# Altium footprint library PrintNC_GRBLHAL_Breakout.PcbLib: 51 footprints (part 4 of 5)
Each footprint in its own frame and in the unit in brackets; x right, y up, seen from the top. Pads: shape width x height; smd on the part's side, far side on the other; paste and mask are expansions set on the pad; w line width, h text height; cw(c..) or ccw(c..) is an arc to the next point about the centre after c.
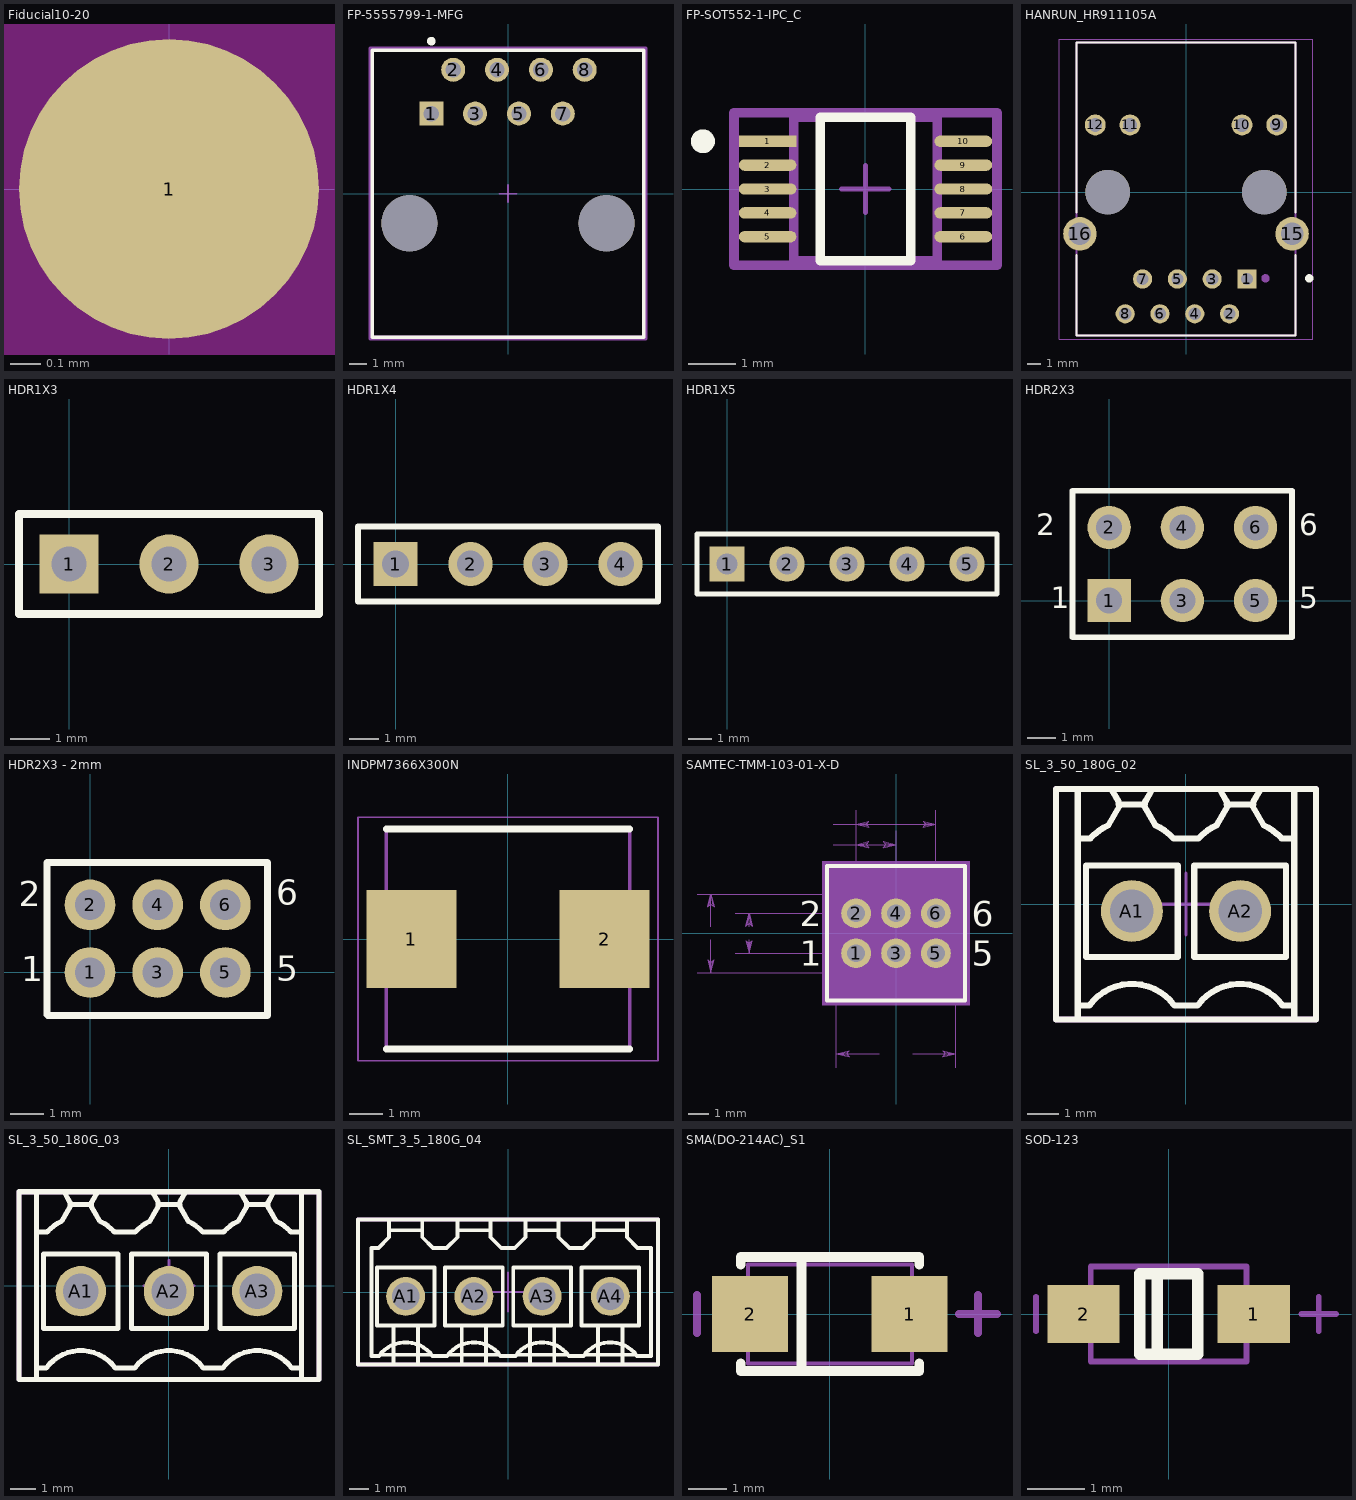
[diagram p3: the footprints below, top view; thin cyan lines are the x and y axes]

## Fiducial10-20 [mm]
height 0.6
pads (1):
  round 1 smd mask+0.5: 1(0,0)
Top Layer keep-out:
  circle w1.178: c0,0 r0.5

## FP-5555799-1-MFG [mm]
pads (10):
  rect 1.39x1.39 hole 0.89 paste-1000 mask+0: 1(-4.445,4.64)
  round 1.39 hole 0.89 paste-1000 mask+0: 2(-3.175,7.18) 3(-1.905,4.64) 4(-0.635,7.18) 5(0.635,4.64) 6(1.905,7.18) 7(3.175,4.64) 8(4.445,7.18)
  round 3.25 hole 3.25 unplated paste-1000 mask+0: ""(-5.715,-1.71) ""(5.715,-1.71)
Top Overlay:
  circle w0.25: c-4.445,8.84 r0.125
  lines w0.2: -7.875,-8.32 7.875,-8.32 7.875,8.32 -7.875,8.32 -7.875,-8.32
Top 3D Body:
  lines w0.2: -7.875,-8.32 7.875,-8.32 7.875,8.32 -7.875,8.32 -7.875,-8.32
Top Courtyard:
  lines w0.2: -7.975,-8.42 7.975,-8.42 7.975,8.42 -7.975,8.42 -7.975,-8.42
Top Assembly:
  lines w0.2: -7.975,-8.42 7.975,-8.42 7.975,8.42 -7.975,8.42 -7.975,-8.42
  text ".Designator" at 0,0.189 h1
Top Component Center:
  lines w0.1: -0.5,0 0.5,0 ; 0,-0.5 0,0.5
3D body "Conn_TE_Connectivity_5555799-1_eec.STEP": height 0.25, standoff 0, extent -7.975,-8.42 7.975,8.42

## FP-SOT552-1-IPC_C [mm]
height 0.6
pads (10):
  rect 1.209x0.236 smd paste+0 mask+0: 1(-2.052,1)
  rrect100% 1.209x0.236 smd paste+0 mask+0: 2(-2.052,0.5) 3(-2.052,0) 4(-2.052,-0.5) 5(-2.052,-1) 6(2.052,-1) 7(2.052,-0.5) 8(2.052,0) 9(2.052,0.5) 10(2.052,1)
Top Overlay:
  circle w0.25: c-3.406,1 r0.125
  lines w0.2: -0.947,-1.5 -0.947,1.5 0.947,1.5 0.947,-1.5 -0.947,-1.5
Top 3D Body:
  lines w0.2: -1.5,-1.5 -1.5,1.5 1.5,1.5 1.5,-1.5 -1.5,-1.5
Top Courtyard:
  lines w0.2: -2.756,-1.6 -2.756,1.6 2.756,1.6 2.756,-1.6 -2.756,-1.6
Top Assembly:
  lines w0.2: -2.756,-1.6 -2.756,1.6 2.756,1.6 2.756,-1.6 -2.756,-1.6
  text ".Designator" at 0,0.189 h1
Top Component Center:
  lines w0.1: -0.5,0 0.5,0 ; 0,-0.5 0,0.5
3D body "IC_NXP_PCA9615DPJ_eec.STEP": height 0.25, standoff 0, extent -2.756,-1.6 2.756,1.6

## HANRUN_HR911105A [mm]
pads (16):
  rect 1.398x1.398 hole 0.89: 1(4.45,-6.35)
  round 1.398 hole 0.89: 2(3.18,-8.89) 3(1.91,-6.35) 4(0.64,-8.89) 5(-0.63,-6.35) 6(-1.9,-8.89) 7(-3.17,-6.35) 8(-4.44,-8.89)
  round 1.53 hole 1.02: 9(6.625,4.9) 10(4.085,4.9) 11(-4.085,4.9) 12(-6.625,4.9)
  round 2.445 hole 1.63: 15(7.745,-3.05) 16(-7.745,-3.05)
  round 3.25 hole 3.25 unplated: ""(-5.715,0) ""(5.715,0)
Top Overlay:
  circle w0.3: c9,-6.3 r0.15
  lines w0.127: -8,-4.6 -8,-10.48 8,-10.48 8,-4.6 ; -8,-1.5 -8,10.92 8,10.92 8,-1.5
Mechanical 13:
  circle w0.3: c5.8,-6.3 r0.15
  lines w0.127: -8,-10.48 8,-10.48 8,10.92 -8,10.92 -8,-10.48
Mechanical 15:
  lines w0.05: -9.25,-10.73 9.25,-10.73 9.25,11.17 -9.25,11.17 -9.25,-10.73

## HDR1X3 [mm] "Connector; Header; 3 Position"
height 0.6
pads (3):
  rect 1.5x1.5 hole 0.9: 1(0,0)
  round 1.5 hole 0.9: 2(2.54,0) 3(5.08,0)
Top Overlay:
  lines w0.2: -1.27,-1.27 -1.27,1.27 6.35,1.27 6.35,-1.27 -1.27,-1.27

## HDR1X4 [mm] "Connector; Header; 4 Position"
pads (4):
  rect 1.5x1.5 hole 0.9: 1(0,0)
  round 1.5 hole 0.9: 2(2.54,0) 3(5.08,0) 4(7.62,0)
Top Overlay:
  lines w0.2: -1.27,-1.27 8.89,-1.27 8.89,1.27 -1.27,1.27 -1.27,-1.27

## HDR1X5 [mm] "Connector; Header; 5 Position"
height 0.6
pads (5):
  rect 1.5x1.5 hole 0.9: 1(0,0)
  round 1.5 hole 0.9: 2(2.54,0) 3(5.08,0) 4(7.62,0) 5(10.16,0)
Top Overlay:
  lines w0.2: -1.27,-1.27 11.43,-1.27 11.43,1.27 -1.27,1.27 -1.27,-1.27

## HDR2X3 [mm] "Connector; Header; 3x2 Position"
pads (6):
  rect 1.5x1.5 hole 0.9: 1(0,0)
  round 1.5 hole 0.9: 2(0,2.54) 3(2.54,0) 4(2.54,2.54) 5(5.08,0) 6(5.08,2.54)
Top Overlay:
  lines w0.2: 1.482,-1.27 6.35,-1.27 ; 6.35,-1.27 -1.27,-1.27 -1.27,3.81 6.35,3.81 6.35,-1.27
  text "1" at -2.032,-0.508 h1.27
  text "2" at -2.54,2.032 h1.27
  text "5" at 6.604,-0.508 h1.27
  text "6" at 6.604,2.032 h1.27

## HDR2X3 - 2mm [mm] "Connector; Header; 3x2 Position"
pads (6):
  round 1.5 hole 0.9: 1(0,0) 2(0,2) 3(2,0) 4(2,2) 5(4,0) 6(4,2)
Top Overlay:
  lines w0.2: -1.27,-1.25 -1.27,3.25 5.25,3.25 5.25,-1.27 -1.25,-1.27
  text "6" at 5.5,1.75 h1.27
  text "5" at 5.5,-0.5 h1.27
  text "2" at -2.1,1.7 h1.27
  text "1" at -2.032,-0.508 h1.27

## INDPM7366X300N [mm]
pads (2):
  rect 2.7x2.95 smd: 1(-2.9,0) 2(2.9,0)
Top Overlay:
  lines w0.2: -3.65,-3.3 3.65,-3.3 ; -3.65,3.3 3.65,3.3
Mechanical 13:
  lines w0.1: -3.65,-3.3 3.65,-3.3 3.65,3.3 -3.65,3.3 -3.65,-3.3
Mechanical 15:
  lines w0.05: -4.5,-3.65 4.5,-3.65 4.5,3.65 -4.5,3.65 -4.5,-3.65
3D body "MHCI06030-220M-R8.stp": height 3, standoff 0, extent -3.65,-3.3 3.65,3.3

## SAMTEC-TMM-103-01-X-D [mm]
pads (6):
  round 1.49 hole 0.89 mask+0: 1(-2,-1) 2(-2,1) 3(0,-1) 4(0,1) 5(2,-1) 6(2,1)
Top Overlay:
  lines w0.2: -3.45,-3.37 -3.45,3.37 3.45,3.37 3.45,-3.37 -3.45,-3.37
  text "1" at -4.82,-1.635 h1.27
  text "2" at -4.82,0.365 h1.27
  text "5" at 3.791,-1.635 h1.27
  text "6" at 3.791,0.365 h1.27
Top Paste:
  drawing of 6 lines, arcs and shapes, not listed
Top Solder:
  circle w0: c-2,-1 r0.796
  circle w0: c-2,1 r0.796
  circle w0: c0,-1 r0.796
  circle w0: c0,1 r0.796
  circle w0: c2,-1 r0.796
  circle w0: c2,1 r0.796
Bottom Solder:
  circle w0: c-2,-1 r0.796
  circle w0: c-2,1 r0.796
  circle w0: c0,-1 r0.796
  circle w0: c0,1 r0.796
  circle w0: c2,-1 r0.796
  circle w0: c2,1 r0.796
Mechanical 13:
  lines w0: -9.972,-1.968 -3.686,-1.968 ; -9.972,1.968 -3.686,1.968 ; -9.271,-0.318 -9.271,-1.968 ; -9.271,0.318 -9.271,1.968 ; -8.067,-1 -2.701,-1 ; -8.067,1 -2.701,1 ; -7.366,-0.318 -7.366,-1 ; -7.366,0.318 -7.366,1 ; -3.15,4.445 -2,4.445 ; -3.15,5.461 -2,5.461 ; -2.984,-6.734 -2.984,-2.67 ; -2,5.146 -2,1.701 -2,6.162 ; -0.851,-6.032 -2.984,-6.032 ; 0,1.701 0,5.146 ; 0.851,-6.032 2.984,-6.032 ; 2,1.701 2,6.162 ; 2.984,-6.734 2.984,-2.67 ; -9.43,-1.334 -9.271,-1.968 ; -9.43,-1.334 -9.271,-1.46 ; -9.43,-1.334 -9.35,-1.397 -9.271,-1.968 ; -9.271,-1.968 -9.112,-1.334 -9.271,-1.46 ; -9.271,-1.968 -9.192,-1.397 -9.271,-1.46 ; -9.271,-1.968 -9.271,-1.46 ; -9.271,1.46 -9.43,1.334 -9.271,1.968 ; -9.271,1.46 -9.112,1.334 ; -9.271,1.46 -9.35,1.397 -9.271,1.968 ; -9.271,1.46 -9.271,1.968 ; -9.271,1.968 -9.112,1.334 ; -9.271,1.968 -9.192,1.397 -9.112,1.334 ; -7.525,-0.365 -7.366,-1 ; -7.525,-0.365 -7.366,-0.492 ; -7.525,-0.365 -7.445,-0.428 -7.366,-1 ; -7.366,-1 -7.207,-0.365 -7.366,-0.492 ; -7.366,-1 -7.287,-0.428 -7.366,-0.492 ; -7.366,-1 -7.366,-0.492 ; -7.366,0.492 -7.525,0.365 -7.366,1 ; -7.366,0.492 -7.207,0.365 ; -7.366,0.492 -7.445,0.428 -7.366,1 ; -7.366,0.492 -7.366,1 ; -7.366,1 -7.207,0.365 ; -7.366,1 -7.287,0.428 -7.207,0.365 ; -2.984,-6.032 -2.35,-5.874 ; -2.984,-6.032 -2.35,-6.191 -2.476,-6.032 ; -2.984,-6.032 -2.413,-6.112 -2.476,-6.032 ; -2.984,-6.032 -2.476,-6.032 ; -2.984,-6.032 -2.413,-5.953 -2.35,-5.874 ; -2.476,-6.032 -2.35,-5.874 ; -2,4.445 -1.365,4.604 ; -2,4.445 -1.365,4.286 -1.492,4.445 ; -2,4.445 -1.428,4.366 -1.492,4.445 ; -2,4.445 -1.492,4.445 ; -2,4.445 -1.428,4.524 -1.365,4.604 ; -2,4.445 0,4.445 ; -2,5.461 -1.365,5.62 ; -2,5.461 -1.365,5.302 -1.492,5.461 ; -2,5.461 -1.428,5.382 -1.492,5.461 ; -2,5.461 -1.492,5.461 ; -2,5.461 -1.428,5.54 -1.365,5.62 ; -2,5.461 2,5.461 ; -1.492,4.445 -1.365,4.604 ; -1.492,5.461 -1.365,5.62 ; -0.635,4.286 0,4.445 ; -0.635,4.286 -0.508,4.445 ; -0.635,4.286 -0.572,4.366 0,4.445 ; -0.508,4.445 -0.635,4.604 0,4.445 ; -0.508,4.445 -0.572,4.524 0,4.445 ; -0.508,4.445 0,4.445 ; 1.365,5.302 2,5.461 ; 1.365,5.302 1.492,5.461 ; 1.365,5.302 1.428,5.382 2,5.461 ; 1.492,5.461 1.365,5.62 2,5.461 ; 1.492,5.461 1.428,5.54 2,5.461 ; 1.492,5.461 2,5.461 ; 2.35,-6.191 2.984,-6.032 ; 2.35,-6.191 2.476,-6.032 ; 2.35,-6.191 2.413,-6.112 2.984,-6.032 ; 2.476,-6.032 2.35,-5.874 2.984,-6.032 ; 2.476,-6.032 2.413,-5.953 2.984,-6.032 ; 2.476,-6.032 2.984,-6.032
  lines w0.1: -3.45,-3.37 -3.45,3.37 3.45,3.37 3.45,-3.37 -3.45,-3.37 ; -3,-1.968 -1,-1.968 1,-1.968 3,-1.968 3,1.968 1,1.968 -1,1.968 -3,1.968 -3,-1.968 ; -2.254,-1.254 -1.746,-1.254 -1.746,-0.746 -2.254,-0.746 -2.254,-1.254 ; -2.254,0.746 -1.746,0.746 -1.746,1.254 -2.254,1.254 -2.254,0.746 ; -0.254,-1.254 0.254,-1.254 0.254,-0.746 -0.254,-0.746 -0.254,-1.254 ; -0.254,0.746 0.254,0.746 0.254,1.254 -0.254,1.254 -0.254,0.746 ; 1.746,-1.254 2.254,-1.254 2.254,-0.746 1.746,-0.746 1.746,-1.254 ; 1.746,0.746 1.746,1.254 2.254,1.254 2.254,0.746 1.746,0.746
  text "3.937" at -9.931,-0.127 h0.25
  text "2.000" at -8.026,-0.127 h0.25
  text "1" at -4.82,-1.635 h1.27
  text "2" at -4.82,0.365 h1.27
  text "2.000" at -4.661,4.318 h0.25
  text "4.000" at -4.661,5.334 h0.25
  text "5.969" at -0.66,-6.16 h0.25
  text "5" at 3.791,-1.635 h1.27
  text "6" at 3.791,0.365 h1.27
Mechanical 15:
  region: 3.685,-3.605 -3.685,-3.605 -3.685,3.605 3.685,3.605

## SL_3_50_180G_02 [mm] "OMNIMATE Signal - Serie BL/SL 3.50  SL 3.50/02/180G 3.2"
height 11.1
pads (2):
  round 2 hole 1.4: A1(-1.75,-0.22) A2(1.75,-0.22)
Top Overlay:
  lines w0.2: -3.5,-3.725 -3.5,3.725 ; -3.5,-3.275 -3.125,-3.275 cw(c-1.75,-4.275) -0.375,-3.275 0.375,-3.275 cw(c1.75,-4.275) 3.125,-3.275 3.5,-3.275 ; -3.5,2.125 -3.092,2.125 cw(c-1.75,0.925) -2.506,2.559 -2.15,3.175 -2.18,3.226 ; -2.416,3.725 -2.179,3.315 -2.179,3.226 ; -1.35,3.175 -0.994,2.559 cw(c-1.75,0.925) -0.408,2.125 0.408,2.125 cw(c1.75,0.925) 0.994,2.559 1.35,3.175 1.32,3.226 ; -1.321,3.226 -2.179,3.226 ; -1.321,3.315 -1.084,3.725 ; 1.084,3.725 1.321,3.315 1.321,3.226 ; 2.15,3.175 2.506,2.559 cw(c1.75,0.925) 3.092,2.125 3.5,2.125 ; 2.179,3.226 1.321,3.226 ; 2.179,3.315 2.416,3.725 ; 3.5,-3.725 3.5,3.725 ; -4.2,-3.725 4.2,-3.725 4.2,3.725 -4.2,3.725 -4.2,-3.725 ; -3.231,-1.706 -0.269,-1.706 -0.269,1.256 -3.231,1.256 -3.231,-1.706 ; 0.269,-1.706 3.231,-1.706 3.231,1.256 0.269,1.256 0.269,-1.706
Mechanical 15:
  lines w0.1: -1,0 1,0 ; 0,-1 0,1
  lines w0.2: -4.2,-3.725 4.2,-3.725 4.2,3.725 -4.2,3.725 -4.2,-3.725
3D body "691321100002.stp": height 9.3, standoff -3.4, extent -4.2,-3.02 4.2,4.18

## SL_3_50_180G_03 [mm] "OMNIMATE Signal - Serie BL/SL 3.50  SL 3.50/03/180G 3.2"
height 11.1
pads (3):
  round 2 hole 1.4: A1(-3.5,-0.22) A2(0,-0.22) A3(3.5,-0.22)
Top Overlay:
  lines w0.2: -5.25,-3.725 -5.25,3.725 ; -5.25,-3.275 -4.875,-3.275 cw(c-3.5,-4.275) -2.125,-3.275 -1.375,-3.275 ; -5.25,2.125 -4.842,2.125 cw(c-3.5,0.925) -4.256,2.559 -3.9,3.175 -3.93,3.226 ; -4.166,3.725 -3.929,3.315 -3.929,3.226 ; -3.1,3.175 -2.744,2.559 cw(c-3.5,0.925) -2.158,2.125 -1.342,2.125 cw(c0,0.925) -0.756,2.559 -0.4,3.175 -0.43,3.226 ; -3.071,3.226 -3.929,3.226 ; -3.071,3.315 -2.834,3.725 ; -1.375,-3.275 cw(c0,-4.275) 1.375,-3.275 2.125,-3.275 cw(c3.5,-4.275) 4.875,-3.275 5.25,-3.275 ; -0.666,3.725 -0.429,3.315 -0.429,3.226 ; 0.4,3.175 0.756,2.559 cw(c0,0.925) 1.342,2.125 2.158,2.125 cw(c3.5,0.925) 2.744,2.559 3.1,3.175 3.07,3.226 ; 0.429,3.226 -0.429,3.226 ; 0.429,3.315 0.666,3.725 ; 2.834,3.725 3.071,3.315 3.071,3.226 ; 3.9,3.175 4.256,2.559 cw(c3.5,0.925) 4.842,2.125 5.25,2.125 ; 3.929,3.226 3.071,3.226 ; 3.929,3.315 4.166,3.725 ; 5.25,-3.725 5.25,3.725 ; -5.95,-3.725 5.95,-3.725 5.95,3.725 -5.95,3.725 -5.95,-3.725 ; -4.981,-1.706 -2.019,-1.706 -2.019,1.256 -4.981,1.256 -4.981,-1.706 ; -1.481,-1.706 1.481,-1.706 1.481,1.256 -1.481,1.256 -1.481,-1.706 ; 2.019,-1.706 4.981,-1.706 4.981,1.256 2.019,1.256 2.019,-1.706
Mechanical 15:
  lines w0.1: -1,0 1,0 ; 0,-1 0,1
  lines w0.2: -5.95,-3.725 5.95,-3.725 5.95,3.725 -5.95,3.725 -5.95,-3.725
3D body "691321100003.stp": height 9.3, standoff -3.4, extent -5.95,-3.02 5.95,4.18

## SL_SMT_3_5_180G_04 [mm] "OMNIMATE Signal - Serie BL/SL 3.50  SL-SMT 3.50/04/180G 1.5"
height 11.1
pads (4):
  round 2 hole 1.4: A1(-5.25,-0.22) A2(-1.75,-0.22) A3(1.75,-0.22) A4(5.25,-0.22)
Top Overlay:
  lines w0.2: -6.1,3.175 -4.4,3.175 ; -6.1,3.725 -6.1,2.816 -6.652,2.264 -7,2.264 -7,-3.275 -6.625,-3.275 ; -5.875,-3.725 -5.875,-1.706 ; -4.625,-3.725 -4.625,-1.706 ; -4.4,3.725 -4.4,2.816 -3.848,2.264 -3.152,2.264 -2.6,2.816 -2.6,3.725 ; -3.5,-3.275 -3.125,-3.275 ; -2.6,3.175 -0.9,3.175 ; -2.375,-3.725 -2.375,-1.706 ; -1.125,-3.725 -1.125,-1.706 ; -0.9,3.725 -0.9,2.816 -0.348,2.264 0.348,2.264 0.9,2.816 0.9,3.725 ; 0,-3.275 0.375,-3.275 ; 0.9,3.175 2.6,3.175 ; 1.125,-3.725 1.125,-1.706 ; 2.375,-3.725 2.375,-1.706 ; 2.6,3.725 2.6,2.816 3.152,2.264 3.848,2.264 4.4,2.816 4.4,3.725 ; 3.5,-3.275 3.875,-3.275 ; 4.4,3.175 6.1,3.175 ; 4.625,-3.725 4.625,-1.706 ; 5.875,-3.725 5.875,-1.706 ; 6.1,3.725 6.1,2.816 6.652,2.264 7.348,2.264 7.348,-3.275 6.625,-3.275 ; -6.625,-3.275 cw(c-5.25,-4.275) -3.875,-3.275 ; -6.625,-3.275 -6.565,-3.215 -3.935,-3.215 -3.875,-3.275 ; -3.875,-3.275 -3.125,-3.275 ; -3.125,-3.275 cw(c-1.75,-4.275) -0.375,-3.275 ; -3.125,-3.275 -3.065,-3.215 -0.435,-3.215 -0.375,-3.275 ; -0.375,-3.275 0.375,-3.275 ; 0.375,-3.275 cw(c1.75,-4.275) 3.125,-3.275 ; 0.375,-3.275 0.435,-3.215 3.065,-3.215 3.125,-3.275 ; 3.125,-3.275 3.875,-3.275 ; 3.875,-3.275 cw(c5.25,-4.275) 6.625,-3.275 ; 3.875,-3.275 3.935,-3.215 6.565,-3.215 6.625,-3.275 ; -7.7,-3.725 7.7,-3.725 7.7,3.725 -7.7,3.725 -7.7,-3.725 ; -6.731,-1.706 -6.731,1.256 -3.769,1.256 -3.769,-1.706 -6.731,-1.706 ; -3.231,-1.706 -0.269,-1.706 -0.269,1.256 -3.231,1.256 -3.231,-1.706 ; 0.269,-1.706 3.231,-1.706 3.231,1.256 0.269,1.256 0.269,-1.706 ; 3.769,-1.706 6.731,-1.706 6.731,1.256 3.769,1.256 3.769,-1.706
Mechanical 15:
  lines w0.1: -1,0 1,0 ; 0,-1 0,1
  lines w0.2: -7.7,-3.725 7.7,-3.725 7.7,3.725 -7.7,3.725 -7.7,-3.725
3D body "691321100004.stp": height 9.3, standoff -3.4, extent -7.7,-3.02 7.7,4.18

## SMA(DO-214AC)_S1 [mm]
height 0.6
pads (2):
  rect 2x2 smd: 1(2.1,0) 2(-2.1,0)
Top Overlay:
  lines w0.254: -2.35,-1.3 -2.35,-1.5 2.35,-1.5 2.35,-1.3 ; -2.35,1.3 -2.35,1.5 2.35,1.5 2.35,1.3 ; -0.75,-1.5 -0.75,1.5
Mechanical 13:
  lines w0.1: -2.16,-1.3 2.16,-1.3 2.16,1.3 -2.16,1.3 -2.16,-1.3
Mechanical 15:
  lines w0.203: -3.5,-0.5 -3.5,0.5 ; 3.4,0 4.4,0 ; 3.9,-0.5 3.9,0.5

## SOD-123 [mm]
height 0.6
pads (2):
  rect 1.25x1 smd: 1(1.475,0) 2(-1.475,0)
Top Overlay:
  lines w0.2: -0.2,-0.7 -0.2,0.7 ; -0.5,-0.7 0.5,-0.7 0.5,0.7 -0.5,0.7 -0.5,-0.7
Mechanical 13:
  lines w0.1: -1.35,-0.825 -1.35,0.825 1.35,0.825 1.35,-0.825 -1.35,-0.825
Mechanical 15:
  lines w0.1: -2.3,-0.3 -2.3,0.3 ; 2.3,0 2.9,0 ; 2.6,-0.3 2.6,0.3
3D body "SOD123.STEP": height 1.35, standoff 0, extent -1.85,-0.775 1.85,0.775